# Altium footprint library TG-Lib.PcbLib: 25 footprints (part 1 of 2)
Each footprint in its own frame and in the unit in brackets; x right, y up, seen from the top. Pads: shape width x height; smd on the part's side, far side on the other; paste and mask are expansions set on the pad; w line width, h text height; cw(c..) or ccw(c..) is an arc to the next point about the centre after c.
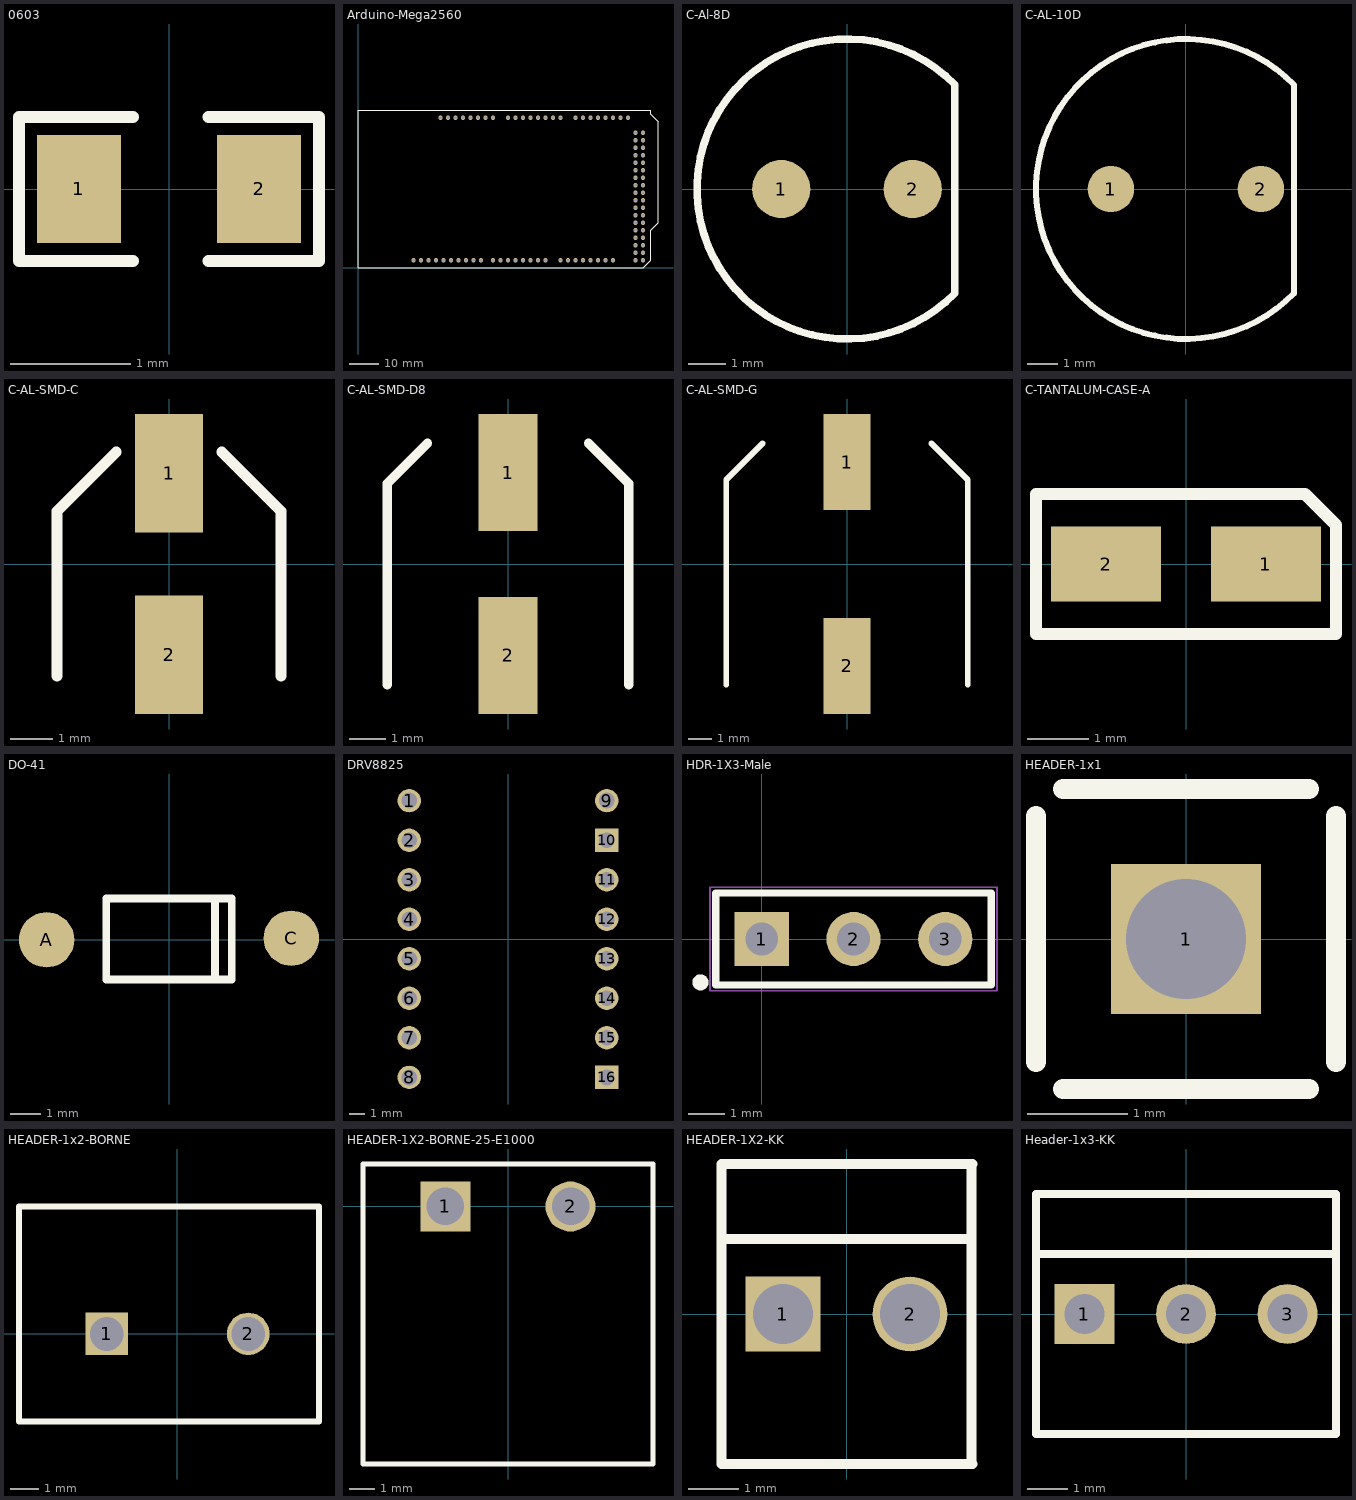
[diagram p0: the footprints below, top view; thin cyan lines are the x and y axes]

## 0603 [mm]
pads (2):
  rect 0.7x0.9 smd: 1(-0.75,0) 2(0.75,0)
Top Overlay:
  lines w0.1: -0.3,-0.6 -1.25,-0.6 -1.25,0.6 -0.3,0.6 ; 0.33,-0.6 1.25,-0.6 1.25,0.6 0.33,0.6
3D body: height 0.87, standoff 0.01, extent -0.8,-0.43 0.8,0.43

## Arduino-Mega2560 [mm]
pads (86):
  round 1.5 hole 1: 1(27.94,50.8) 2(30.48,50.8) 3(33.02,50.8) 4(35.56,50.8) 5(38.1,50.8) 6(40.64,50.8) 7(43.18,50.8) 8(45.72,50.8) 9(50.8,50.8) 10(53.34,50.8) 11(55.88,50.8) 12(58.42,50.8) 13(60.96,50.8) 14(63.5,50.8) 15(66.04,50.8) 16(68.58,50.8) 17(73.66,50.8) 18(76.2,50.8) 19(78.74,50.8) 20(81.28,50.8) 21(83.82,50.8) 22(86.36,50.8) 23(88.9,50.8) 24(91.44,50.8) 25(96.52,45.72) 26(93.98,45.72) 27(96.52,43.18) 28(93.98,43.18) 29(96.52,40.64) 30(93.98,40.64) 31(96.52,38.1) 32(93.98,38.1) 33(96.52,35.56) 34(93.98,35.56) 35(96.52,33.02) 36(93.98,33.02) 37(96.52,30.48) 38(93.98,30.48) 39(96.52,27.94) 40(93.98,27.94) 41(96.52,25.4) 42(93.98,25.4) 43(96.52,22.86) 44(93.98,22.86) 45(96.52,20.32) 46(93.98,20.32) 47(96.52,17.78) 48(93.98,17.78) 49(96.52,15.24) 50(93.98,15.24) 51(96.52,12.7) 52(93.98,12.7) 53(96.52,10.16) 54(93.98,10.16) 55(96.52,7.62) 56(93.98,7.62) 57(96.52,5.08) 58(93.98,5.08) 59(96.52,2.54) 60(93.98,2.54) 61(86.36,2.54) 62(83.82,2.54) 63(81.28,2.54) 64(78.74,2.54) 65(76.2,2.54) 66(73.66,2.54) 67(71.12,2.54) 68(68.58,2.54) 69(63.5,2.54) 70(60.96,2.54) 71(58.42,2.54) 72(55.88,2.54) 73(53.34,2.54) 74(50.8,2.54) 75(48.26,2.54) 76(45.72,2.54) 77(41.656,2.54) 78(39.116,2.54) 79(36.576,2.54) 80(34.036,2.54) 81(31.496,2.54) 82(28.956,2.54) 83(26.416,2.54) 84(23.876,2.54) 85(21.336,2.54) 86(18.796,2.54)
Top Overlay:
  lines w0.2: 0,0 96.52,0 99.06,2.54 99.06,12.7 101.6,15.24 101.6,49.53 99.06,52.07 99.06,53.34 0,53.34 0,0
3D body: height 15.2, standoff -0.05, extent -6.477,0 101.473,53.34
3D body: height 8.9, standoff -3.04, extent 17.526,1.27 42.926,3.81
3D body: height 8.9, standoff -3.04, extent 67.31,1.27 87.63,3.81
3D body: height 8.9, standoff -3.04, extent 44.45,1.27 64.77,3.81
3D body: height 8.9, standoff -3.04, extent 72.39,49.53 92.71,52.07
3D body: height 8.9, standoff -3.04, extent 49.53,49.53 69.85,52.07
3D body: height 8.9, standoff -3.04, extent 26.67,49.53 46.99,52.07
3D body: height 8.9, standoff -3.04, extent 92.71,1.27 97.79,46.99

## C-Al-8D [mm]
pads (2):
  round 1.55 smd: 1(-1.75,0) 2(1.75,0)
Top Overlay:
  lines w0.2: 2.875,-2.775 cw(c0,0) 2.875,2.775 2.875,-2.775
3D body: height 16, standoff 0, extent -3.968,-3.992 4,3.992

## C-AL-10D [mm]
pads (2):
  round 1.55 smd: 1(-2.5,0) 2(2.5,0)
Top Overlay:
  lines w0.2: 3.598,-3.472 cw(c0,0) 3.598,3.472 ; 3.6,-3.475 3.6,2.05 ; 3.6,3.475 3.6,2.05 ; 3.6,2.05 3.6,2.05
3D body: height 16, standoff 0, extent -4.96,-4.99 5,4.99

## C-AL-SMD-C [mm]
pads (2):
  rect 1.6x2.8 smd: 1(0,2.15) 2(0,-2.15)
Top Overlay:
  lines w0.25: -2.65,-2.65 -2.65,1.25 -1.25,2.65 ; 1.25,2.65 2.65,1.25 2.65,-2.65
3D body: height 6.32, standoff -0.29, extent -2.65,-2.95 2.65,2.95

## C-AL-SMD-D8 [mm]
pads (2):
  rect 1.6x3.2 smd: 1(0,2.5) 2(0,-2.5)
Top Overlay:
  lines w0.25: -3.3,-3.3 -3.3,2.2 -2.2,3.3 ; 2.2,3.3 3.3,2.2 3.3,-3.3
3D body: height 8.52, standoff 0.01, extent -3.35,-3.5 3.25,3.5

## C-AL-SMD-G [mm]
pads (2):
  rect 2x4.1 smd: 1(0,4.35) 2(0,-4.35)
Top Overlay:
  lines w0.25: -5.15,-5.15 -5.15,3.6 -3.6,5.15 ; 5.15,-5.15 5.15,3.6
  lines w0.254: 3.6,5.15 5.15,3.6
3D body: height 11.02, standoff 0.01, extent -5.15,-5.8 5.15,5.8

## C-TANTALUM-CASE-A [mm]
pads (2):
  rect 1.8x1.23 smd: 1(1.31,0) 2(-1.31,0)
Top Overlay:
  lines w0.2: -2.46,-1.15 2.46,-1.15 2.46,0.64 1.95,1.15 -2.46,1.15 -2.46,-1.15
3D body: height 1.61, standoff 0.01, extent -1.6,-0.8 1.6,0.8

## DO-41 [mm]
pads (2):
  round 1.81 smd: A(-4,0) C(4,0.05)
Top Overlay:
  lines w0.254: -2.05,1.3 -2.05,-1.3 2.05,-1.3 2.05,1.3 ; -2.05,1.35 2.05,1.35 ; 1.5,-1.3 1.5,1.35

## DRV8825 [mm]
pads (16):
  round 1.5 hole 1.02: 1(-6.35,8.89) 2(-6.35,6.35) 3(-6.35,3.81) 4(-6.35,1.27) 5(-6.35,-1.27) 6(-6.35,-3.81) 7(-6.35,-6.35) 8(-6.35,-8.89) 9(6.35,8.89) 11(6.35,3.81) 12(6.35,1.27) 13(6.35,-1.27) 14(6.35,-3.81) 15(6.35,-6.35)
  rect 1.5x1.5 hole 1.02: 10(6.35,6.35) 16(6.35,-8.89)
3D body: height 8.51, standoff -2.99, extent -7.62,-10.41 -5.08,10.41
3D body: height 8.51, standoff -2.99, extent 5.08,-10.41 7.62,10.41

## HDR-1X3-Male [mm]
pads (3):
  rect 1.5x1.5 hole 0.9: 1(0,0)
  round 1.5 hole 0.9: 2(2.54,0) 3(5.08,0)
Top Overlay:
  circle w0.254: c-1.695,-1.2 r0.095
  lines w0.2: -1.27,-1.27 6.35,-1.27 6.35,1.27 -1.27,1.27 -1.27,-1.27
Mechanical 1:
  lines w0.05: -1.43,-1.43 6.51,-1.43 6.51,1.43 -1.43,1.43 -1.43,-1.43
Mechanical 2:
  lines w0.001: -1.27,-1.27 -1.27,1.27 6.35,1.27 6.35,-1.27 -1.27,-1.27
Mechanical 3:
  lines w0.1: -1.27,-1.3 -1.27,1.27 6.35,1.27 6.35,-1.3 -1.27,-1.3
3D body: height 8.4, standoff -2.52, extent -1.27,-1.27 6.35,1.27

## HEADER-1x1 [mm]
pads (1):
  rect 1.5x1.5 hole 1.2: 1(0,0)
Top Overlay:
  lines w0.2: -1.5,-1.23 -1.5,1.23 ; -1.23,-1.5 1.23,-1.5 ; -1.23,1.5 1.23,1.5 ; 1.5,-1.23 1.5,1.23
3D body: height 8.55, standoff -2.99, extent -1.27,-1.27 1.27,1.27

## HEADER-1x2-BORNE [mm]
pads (2):
  rect 1.5x1.5 hole 1.2: 1(-2.5,0)
  round 1.5 hole 1.2: 2(2.5,0)
Top Overlay:
  lines w0.2: -5.6,-3.1 -5.6,4.5 5,4.5 5,-3.1 -5.6,-3.1

## HEADER-1X2-BORNE-25-E1000 [mm]
pads (2):
  rect 2x2 hole 1.5: 1(-2.5,0)
  round 2 hole 1.5: 2(2.5,0)
Top Overlay:
  lines w0.2: -5.8,-10.3 -5.8,1.7 5.8,1.7 5.8,-10.3 -5.8,-10.3

## HEADER-1X2-KK [mm]
pads (2):
  rect 1.5x1.5 hole 1.2: 1(-1.27,0)
  round 1.5 hole 1.2: 2(1.27,0)
Top Overlay:
  lines w0.2: -2.5,-3 -2.5,3 ; -2.5,1.5 2.5,1.5 ; -2.48,-3 2.52,-3 ; -2.48,3 2.52,3 ; 2.5,-3 2.5,3
3D body: height 10.68, standoff -3.54, extent -2.464,-3.251 2.464,3.099

## Header-1x3-KK [mm]
pads (3):
  rect 1.5x1.5 hole 1: 1(-2.54,0)
  round 1.5 hole 1: 2(0,0) 3(2.54,0)
Top Overlay:
  lines w0.2: -3.75,1.5 3.725,1.5 ; -3.75,-3 -3.75,3 3.75,3 3.75,-3 -3.75,-3
3D body: height 10.68, standoff -3.54, extent -3.734,-3.251 3.734,3.099